# Altium footprint library 2.01-LQFP、TQFP封装.PcbLib: 191 footprints (part 11 of 13)
Each footprint in its own frame and in the unit in brackets; x right, y up, seen from the top. Pads: shape width x height; smd on the part's side, far side on the other; paste and mask are expansions set on the pad; w line width, h text height; cw(c..) or ccw(c..) is an arc to the next point about the centre after c.
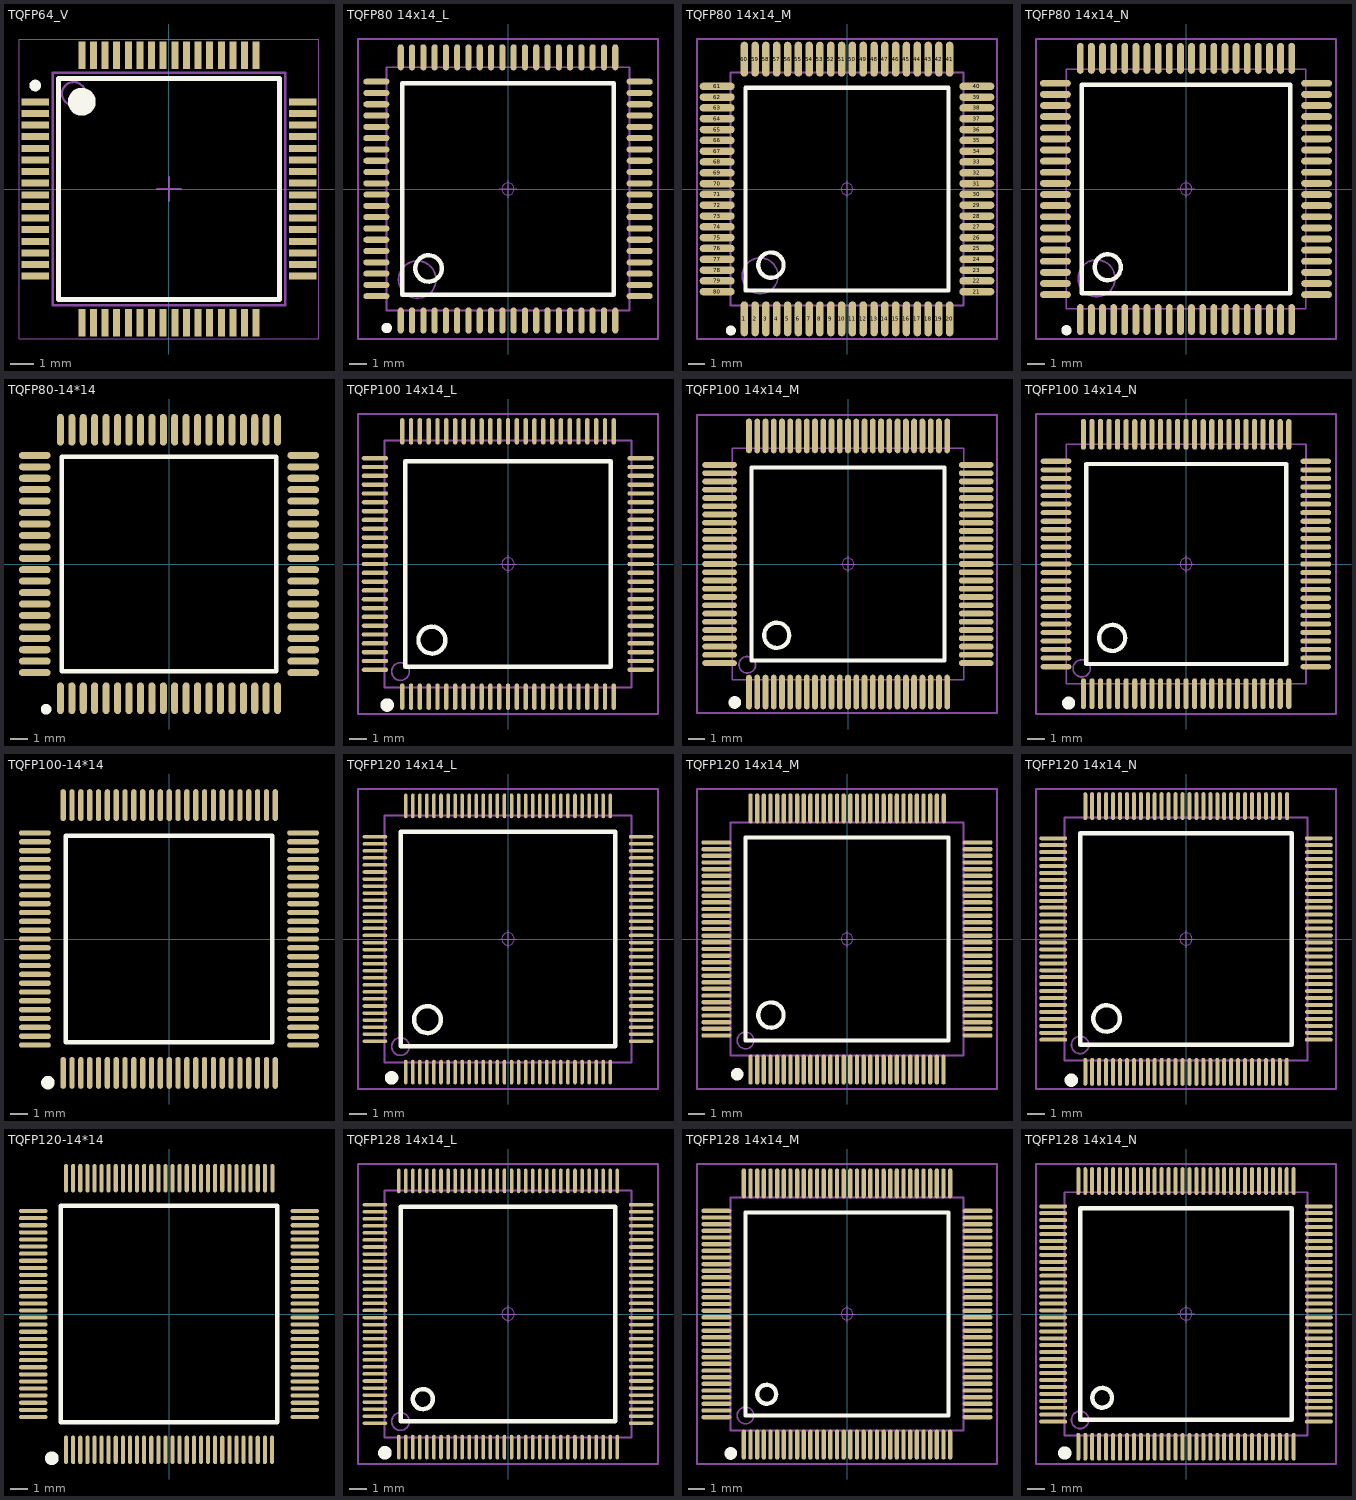
[diagram p10: the footprints below, top view; thin cyan lines are the x and y axes]

## TQFP64_V [mm] "Thin QFP, 64-Leads, Body 10x10mm, Pitch 0.5mm, ST Recommended"
height 1.6
pads (64):
  rect 1.2x0.3 smd: 1(-5.75,3.75) 2(-5.75,3.25) 3(-5.75,2.75) 4(-5.75,2.25) 5(-5.75,1.75) 6(-5.75,1.25) 7(-5.75,0.75) 8(-5.75,0.25) 9(-5.75,-0.25) 10(-5.75,-0.75) 11(-5.75,-1.25) 12(-5.75,-1.75) 13(-5.75,-2.25) 14(-5.75,-2.75) 15(-5.75,-3.25) 16(-5.75,-3.75) 33(5.75,-3.75) 34(5.75,-3.25) 35(5.75,-2.75) 36(5.75,-2.25) 37(5.75,-1.75) 38(5.75,-1.25) 39(5.75,-0.75) 40(5.75,-0.25) 41(5.75,0.25) 42(5.75,0.75) 43(5.75,1.25) 44(5.75,1.75) 45(5.75,2.25) 46(5.75,2.75) 47(5.75,3.25) 48(5.75,3.75)
  rect 0.3x1.2 smd: 17(-3.75,-5.75) 18(-3.25,-5.75) 19(-2.75,-5.75) 20(-2.25,-5.75) 21(-1.75,-5.75) 22(-1.25,-5.75) 23(-0.75,-5.75) 24(-0.25,-5.75) 25(0.25,-5.75) 26(0.75,-5.75) 27(1.25,-5.75) 28(1.75,-5.75) 29(2.25,-5.75) 30(2.75,-5.75) 31(3.25,-5.75) 32(3.75,-5.75) 49(3.75,5.75) 50(3.25,5.75) 51(2.75,5.75) 52(2.25,5.75) 53(1.75,5.75) 54(1.25,5.75) 55(0.75,5.75) 56(0.25,5.75) 57(-0.25,5.75) 58(-0.75,5.75) 59(-1.25,5.75) 60(-1.75,5.75) 61(-2.25,5.75) 62(-2.75,5.75) 63(-3.25,5.75) 64(-3.75,5.75)
Top Overlay:
  circle w0.6: c-3.75,3.75 r0.3
  circle w0.25: c-5.75,4.45 r0.125
  lines w0.2: -4.75,-4.75 4.75,-4.75 4.75,4.75 -4.75,4.75 -4.75,-4.75
Mechanical 13:
  circle w0.1: c-4.1,4.1 r0.5
  lines w0.1: -5,-5 5,-5 5,5 -5,5 -5,-5
Mechanical 15:
  lines w0.05: -6.45,-6.45 6.45,-6.45 6.45,6.45 -6.45,6.45 -6.45,-6.45
  lines w0.1: -0.5,0 0.5,0 ; 0,-0.5 0,0.5
3D body: height 1.6, standoff 0.05, extent -5,-5 5,5

## TQFP80 14x14_L [mm] "80脚，体宽：14x14mm, 脚距：0.65mm"
pads (80):
  oval 0.35x1.5 smd: 1(-6.175,-7.574) 2(-5.525,-7.574) 3(-4.875,-7.574) 4(-4.225,-7.574) 5(-3.575,-7.574) 6(-2.925,-7.574) 7(-2.275,-7.574) 8(-1.625,-7.574) 9(-0.975,-7.574) 10(-0.325,-7.574) 11(0.325,-7.574) 12(0.975,-7.574) 13(1.625,-7.574) 14(2.275,-7.574) 15(2.925,-7.574) 16(3.575,-7.574) 17(4.225,-7.574) 18(4.875,-7.574) 19(5.525,-7.574) 20(6.175,-7.574) 41(6.175,7.579) 42(5.525,7.579) 43(4.875,7.579) 44(4.225,7.579) 45(3.575,7.579) 46(2.925,7.579) 47(2.275,7.579) 48(1.625,7.579) 49(0.975,7.579) 50(0.325,7.579) 51(-0.325,7.579) 52(-0.975,7.579) 53(-1.625,7.579) 54(-2.275,7.579) 55(-2.925,7.579) 56(-3.575,7.579) 57(-4.225,7.579) 58(-4.875,7.579) 59(-5.525,7.579) 60(-6.175,7.579)
  oval 1.5x0.35 smd: 21(7.577,-6.172) 22(7.577,-5.522) 23(7.577,-4.872) 24(7.577,-4.222) 25(7.577,-3.572) 26(7.577,-2.922) 27(7.577,-2.272) 28(7.577,-1.622) 29(7.577,-0.972) 30(7.577,-0.322) 31(7.577,0.328) 32(7.577,0.978) 33(7.577,1.628) 34(7.577,2.278) 35(7.577,2.928) 36(7.577,3.578) 37(7.577,4.228) 38(7.577,4.878) 39(7.577,5.528) 40(7.577,6.178) 61(-7.577,6.178) 62(-7.577,5.528) 63(-7.577,4.878) 64(-7.577,4.228) 65(-7.577,3.578) 66(-7.577,2.928) 67(-7.577,2.278) 68(-7.577,1.628) 69(-7.577,0.978) 70(-7.577,0.328) 71(-7.577,-0.322) 72(-7.577,-0.972) 73(-7.577,-1.622) 74(-7.577,-2.272) 75(-7.577,-2.922) 76(-7.577,-3.572) 77(-7.577,-4.222) 78(-7.577,-4.872) 79(-7.577,-5.522) 80(-7.577,-6.172)
Top Overlay:
  circle w0.35: c-6.983,-8.001 r0.125
  circle w0.254: c-4.572,-4.572 r0.762
  lines w0.254: -6.096,-6.096 6.096,-6.096 6.096,6.096 -6.096,6.096 -6.096,-6.096
Mechanical 13:
  circle w0.1: c-5.222,-5.219 r1.078
  lines w0.1: -7,-6.997 -7,7.003 7,7.003 7,-6.997 -7,-6.997
Mechanical 15:
  circle w0.05: c0,0.003 r0.35
  lines w0.05: -0.5,0.003 0.5,0.003 ; 0,-0.497 0,0.503
  lines w0.1: -8.636,-8.636 8.636,-8.636 8.636,8.636 -8.636,8.636 -8.636,-8.636
3D body: height 1.05, standoff 0, extent -8.002,-8.002 8.002,8.002

## TQFP80 14x14_M [mm] "80脚，体宽：14x14mm, 脚距：0.65mm  淘宝ID:黄晶宝石"
pads (80):
  oval 0.45x2.1 smd: 1(-6.175,-7.805) 2(-5.525,-7.805) 3(-4.875,-7.805) 4(-4.225,-7.805) 5(-3.575,-7.805) 6(-2.925,-7.805) 7(-2.275,-7.805) 8(-1.625,-7.805) 9(-0.975,-7.805) 10(-0.325,-7.805) 11(0.325,-7.805) 12(0.975,-7.805) 13(1.625,-7.805) 14(2.275,-7.805) 15(2.925,-7.805) 16(3.575,-7.805) 17(4.225,-7.805) 18(4.875,-7.805) 19(5.525,-7.805) 20(6.175,-7.805) 41(6.175,7.805) 42(5.525,7.805) 43(4.875,7.805) 44(4.225,7.805) 45(3.575,7.805) 46(2.925,7.805) 47(2.275,7.805) 48(1.625,7.805) 49(0.975,7.805) 50(0.325,7.805) 51(-0.325,7.805) 52(-0.975,7.805) 53(-1.625,7.805) 54(-2.275,7.805) 55(-2.925,7.805) 56(-3.575,7.805) 57(-4.225,7.805) 58(-4.875,7.805) 59(-5.525,7.805) 60(-6.175,7.805)
  oval 2.1x0.45 smd: 21(7.805,-6.175) 22(7.805,-5.525) 23(7.805,-4.875) 24(7.805,-4.225) 25(7.805,-3.575) 26(7.805,-2.925) 27(7.805,-2.275) 28(7.805,-1.625) 29(7.805,-0.975) 30(7.805,-0.325) 31(7.805,0.325) 32(7.805,0.975) 33(7.805,1.625) 34(7.805,2.275) 35(7.805,2.925) 36(7.805,3.575) 37(7.805,4.225) 38(7.805,4.875) 39(7.805,5.525) 40(7.805,6.175) 61(-7.805,6.175) 62(-7.805,5.525) 63(-7.805,4.875) 64(-7.805,4.225) 65(-7.805,3.575) 66(-7.805,2.925) 67(-7.805,2.275) 68(-7.805,1.625) 69(-7.805,0.975) 70(-7.805,0.325) 71(-7.805,-0.325) 72(-7.805,-0.975) 73(-7.805,-1.625) 74(-7.805,-2.275) 75(-7.805,-2.925) 76(-7.805,-3.575) 77(-7.805,-4.225) 78(-7.805,-4.875) 79(-7.805,-5.525) 80(-7.805,-6.175)
Top Overlay:
  circle w0.35: c-6.985,-8.509 r0.125
  circle w0.254: c-4.572,-4.575 r0.762
  lines w0.254: -6.096,-6.099 6.096,-6.099 6.096,6.093 -6.096,6.093 -6.096,-6.099
Mechanical 13:
  circle w0.1: c-5.222,-5.222 r1.078
  lines w0.1: -7,-7 -7,7 7,7 7,-7 -7,-7
Mechanical 15:
  circle w0.05: c0,0 r0.35
  lines w0.05: -0.5,0 0.5,0 ; 0,-0.5 0,0.5
  lines w0.1: -9.017,-9.017 9.017,-9.017 9.017,9.017 -9.017,9.017 -9.017,-9.017
3D body: height 1.05, standoff 0, extent -8.002,-8.002 8.002,8.002

## TQFP80 14x14_N [mm] "80脚，体宽：14x14mm, 脚距：0.65mm"
pads (80):
  oval 0.4x1.8 smd: 1(-6.175,-7.625) 2(-5.525,-7.625) 3(-4.875,-7.625) 4(-4.225,-7.625) 5(-3.575,-7.625) 6(-2.925,-7.625) 7(-2.275,-7.625) 8(-1.625,-7.625) 9(-0.975,-7.625) 10(-0.325,-7.625) 11(0.325,-7.625) 12(0.975,-7.625) 13(1.625,-7.625) 14(2.275,-7.625) 15(2.925,-7.625) 16(3.575,-7.625) 17(4.225,-7.625) 18(4.875,-7.625) 19(5.525,-7.625) 20(6.175,-7.625) 41(6.175,7.63) 42(5.525,7.63) 43(4.875,7.63) 44(4.225,7.63) 45(3.575,7.63) 46(2.925,7.63) 47(2.275,7.63) 48(1.625,7.63) 49(0.975,7.63) 50(0.325,7.63) 51(-0.325,7.63) 52(-0.975,7.63) 53(-1.625,7.63) 54(-2.275,7.63) 55(-2.925,7.63) 56(-3.575,7.63) 57(-4.225,7.63) 58(-4.875,7.63) 59(-5.525,7.63) 60(-6.175,7.63)
  oval 1.8x0.4 smd: 21(7.627,-6.172) 22(7.627,-5.522) 23(7.627,-4.872) 24(7.627,-4.222) 25(7.627,-3.572) 26(7.627,-2.922) 27(7.627,-2.272) 28(7.627,-1.622) 29(7.627,-0.972) 30(7.627,-0.322) 31(7.627,0.328) 32(7.627,0.978) 33(7.627,1.628) 34(7.627,2.278) 35(7.627,2.928) 36(7.627,3.578) 37(7.627,4.228) 38(7.627,4.878) 39(7.627,5.528) 40(7.627,6.178) 61(-7.627,6.178) 62(-7.627,5.528) 63(-7.627,4.878) 64(-7.627,4.228) 65(-7.627,3.578) 66(-7.627,2.928) 67(-7.627,2.278) 68(-7.627,1.628) 69(-7.627,0.978) 70(-7.627,0.328) 71(-7.627,-0.322) 72(-7.627,-0.972) 73(-7.627,-1.622) 74(-7.627,-2.272) 75(-7.627,-2.922) 76(-7.627,-3.572) 77(-7.627,-4.222) 78(-7.627,-4.872) 79(-7.627,-5.522) 80(-7.627,-6.172)
Top Overlay:
  circle w0.35: c-6.985,-8.255 r0.125
  circle w0.254: c-4.572,-4.572 r0.762
  lines w0.254: -6.096,-6.096 6.096,-6.096 6.096,6.096 -6.096,6.096 -6.096,-6.096
Mechanical 13:
  circle w0.1: c-5.222,-5.219 r1.078
  lines w0.1: -7,-6.997 -7,7.003 7,7.003 7,-6.997 -7,-6.997
Mechanical 15:
  circle w0.05: c0,0.003 r0.35
  lines w0.05: -0.5,0.003 0.5,0.003 ; 0,-0.497 0,0.503
  lines w0.1: -8.763,-8.763 8.763,-8.763 8.763,8.763 -8.763,8.763 -8.763,-8.763
3D body: height 1.05, standoff 0, extent -8.002,-8.002 8.002,8.002

## TQFP80-14*14 [mm] "14x14mm, 0.65mm       封装库来自淘宝卖家 ID：黄晶宝石"
pads (80):
  oval 0.4x1.8 smd: 1(-6.175,-7.625) 2(-5.525,-7.625) 3(-4.875,-7.625) 4(-4.225,-7.625) 5(-3.575,-7.625) 6(-2.925,-7.625) 7(-2.275,-7.625) 8(-1.625,-7.625) 9(-0.975,-7.625) 10(-0.325,-7.625) 11(0.325,-7.625) 12(0.975,-7.625) 13(1.625,-7.625) 14(2.275,-7.625) 15(2.925,-7.625) 16(3.575,-7.625) 17(4.225,-7.625) 18(4.875,-7.625) 19(5.525,-7.625) 20(6.175,-7.625) 41(6.175,7.63) 42(5.525,7.63) 43(4.875,7.63) 44(4.225,7.63) 45(3.575,7.63) 46(2.925,7.63) 47(2.275,7.63) 48(1.625,7.63) 49(0.975,7.63) 50(0.325,7.63) 51(-0.325,7.63) 52(-0.975,7.63) 53(-1.625,7.63) 54(-2.275,7.63) 55(-2.925,7.63) 56(-3.575,7.63) 57(-4.225,7.63) 58(-4.875,7.63) 59(-5.525,7.63) 60(-6.175,7.63)
  oval 1.8x0.4 smd: 21(7.627,-6.172) 22(7.627,-5.522) 23(7.627,-4.872) 24(7.627,-4.222) 25(7.627,-3.572) 26(7.627,-2.922) 27(7.627,-2.272) 28(7.627,-1.622) 29(7.627,-0.972) 30(7.627,-0.322) 31(7.627,0.328) 32(7.627,0.978) 33(7.627,1.628) 34(7.627,2.278) 35(7.627,2.928) 36(7.627,3.578) 37(7.627,4.228) 38(7.627,4.878) 39(7.627,5.528) 40(7.627,6.178) 61(-7.627,6.178) 62(-7.627,5.528) 63(-7.627,4.878) 64(-7.627,4.228) 65(-7.627,3.578) 66(-7.627,2.928) 67(-7.627,2.278) 68(-7.627,1.628) 69(-7.627,0.978) 70(-7.627,0.328) 71(-7.627,-0.322) 72(-7.627,-0.972) 73(-7.627,-1.622) 74(-7.627,-2.272) 75(-7.627,-2.922) 76(-7.627,-3.572) 77(-7.627,-4.222) 78(-7.627,-4.872) 79(-7.627,-5.522) 80(-7.627,-6.172)
Top Overlay:
  circle w0.35: c-6.985,-8.255 r0.125
  lines w0.254: -6.096,-6.096 -6.096,6.096 6.096,6.096 6.096,-6.096 -6.096,-6.096
3D body: height 1.05, standoff 0, extent -8.002,-8.002 8.002,8.002

## TQFP100 14x14_L [mm] "100脚，体宽：14x14mm, 脚距：0.5mm          淘宝ID:黄晶宝石"
pads (100):
  oval 0.25x1.5 smd: 1(-6,-7.524) 2(-5.5,-7.524) 3(-5,-7.524) 4(-4.5,-7.524) 5(-4,-7.524) 6(-3.5,-7.524) 7(-3,-7.524) 8(-2.5,-7.524) 9(-2,-7.524) 10(-1.5,-7.524) 11(-1,-7.524) 12(-0.5,-7.524) 13(0,-7.524) 14(0.5,-7.524) 15(1,-7.524) 16(1.5,-7.524) 17(2,-7.524) 18(2.5,-7.524) 19(3,-7.524) 20(3.5,-7.524) 21(4,-7.524) 22(4.5,-7.524) 23(5,-7.524) 24(5.5,-7.524) 25(6,-7.524) 51(6,7.524) 52(5.5,7.524) 53(5,7.524) 54(4.5,7.524) 55(4,7.524) 56(3.5,7.524) 57(3,7.524) 58(2.5,7.524) 59(2,7.524) 60(1.5,7.524) 61(1,7.524) 62(0.5,7.524) 63(0,7.524) 64(-0.5,7.524) 65(-1,7.524) 66(-1.5,7.524) 67(-2,7.524) 68(-2.5,7.524) 69(-3,7.524) 70(-3.5,7.524) 71(-4,7.524) 72(-4.5,7.524) 73(-5,7.524) 74(-5.5,7.524) 75(-6,7.524)
  oval 1.5x0.25 smd: 26(7.524,-6) 27(7.524,-5.5) 28(7.524,-5) 29(7.524,-4.5) 30(7.524,-4) 31(7.524,-3.5) 32(7.524,-3) 33(7.524,-2.5) 34(7.524,-2) 35(7.524,-1.5) 36(7.524,-1) 37(7.524,-0.5) 38(7.524,0) 39(7.524,0.5) 40(7.524,1) 41(7.524,1.5) 42(7.524,2) 43(7.524,2.5) 44(7.524,3) 45(7.524,3.5) 46(7.524,4) 47(7.524,4.5) 48(7.524,5) 49(7.524,5.5) 50(7.524,6) 76(-7.549,6) 77(-7.549,5.5) 78(-7.549,5) 79(-7.549,4.5) 80(-7.549,4) 81(-7.549,3.5) 82(-7.549,3) 83(-7.549,2.5) 84(-7.549,2) 85(-7.549,1.5) 86(-7.549,1) 87(-7.549,0.5) 88(-7.549,0) 89(-7.549,-0.5) 90(-7.549,-1) 91(-7.549,-1.5) 92(-7.549,-2) 93(-7.549,-2.5) 94(-7.549,-3) 95(-7.549,-3.5) 96(-7.549,-4) 97(-7.549,-4.5) 98(-7.549,-5) 99(-7.549,-5.5) 100(-7.549,-6)
Top Overlay:
  circle w0.254: c-4.318,-4.318 r0.762
  circle w0.508: c-6.858,-8.001 r0.127
  lines w0.254: -5.842,-5.842 5.842,-5.842 5.842,5.842 -5.842,5.842 -5.842,-5.842
Mechanical 13:
  circle w0.1: c-6.1,-6.1 r0.5
  lines w0.1: -7,-7 7,-7 7,7 -7,7 -7,-7
Mechanical 15:
  circle w0.05: c0,0 r0.35
  lines w0.05: -0.5,0 0.5,0 ; 0,-0.5 0,0.5
  lines w0.1: -8.509,-8.509 8.509,-8.509 8.509,8.509 -8.509,8.509 -8.509,-8.509
3D body: height 1.05, standoff 0, extent -8.002,-8.002 8.002,8.002

## TQFP100 14x14_M [mm] "100脚，体宽：14x14mm, 脚距：0.5mm"
pads (100):
  oval 0.35x2.1 smd: 1(-6,-7.752) 2(-5.5,-7.752) 3(-5,-7.752) 4(-4.5,-7.752) 5(-4,-7.752) 6(-3.5,-7.752) 7(-3,-7.752) 8(-2.5,-7.752) 9(-2,-7.752) 10(-1.5,-7.752) 11(-1,-7.752) 12(-0.5,-7.752) 13(0,-7.752) 14(0.5,-7.752) 15(1,-7.752) 16(1.5,-7.752) 17(2,-7.752) 18(2.5,-7.752) 19(3,-7.752) 20(3.5,-7.752) 21(4,-7.752) 22(4.5,-7.752) 23(5,-7.752) 24(5.5,-7.752) 25(6,-7.752) 51(6,7.752) 52(5.5,7.752) 53(5,7.752) 54(4.5,7.752) 55(4,7.752) 56(3.5,7.752) 57(3,7.752) 58(2.5,7.752) 59(2,7.752) 60(1.5,7.752) 61(1,7.752) 62(0.5,7.752) 63(0,7.752) 64(-0.5,7.752) 65(-1,7.752) 66(-1.5,7.752) 67(-2,7.752) 68(-2.5,7.752) 69(-3,7.752) 70(-3.5,7.752) 71(-4,7.752) 72(-4.5,7.752) 73(-5,7.752) 74(-5.5,7.752) 75(-6,7.752)
  oval 2.1x0.35 smd: 26(7.752,-6) 27(7.752,-5.5) 28(7.752,-5) 29(7.752,-4.5) 30(7.752,-4) 31(7.752,-3.5) 32(7.752,-3) 33(7.752,-2.5) 34(7.752,-2) 35(7.752,-1.5) 36(7.752,-1) 37(7.752,-0.5) 38(7.752,0) 39(7.752,0.5) 40(7.752,1) 41(7.752,1.5) 42(7.752,2) 43(7.752,2.5) 44(7.752,3) 45(7.752,3.5) 46(7.752,4) 47(7.752,4.5) 48(7.752,5) 49(7.752,5.5) 50(7.752,6) 76(-7.778,6) 77(-7.778,5.5) 78(-7.778,5) 79(-7.778,4.5) 80(-7.778,4) 81(-7.778,3.5) 82(-7.778,3) 83(-7.778,2.5) 84(-7.778,2) 85(-7.778,1.5) 86(-7.778,1) 87(-7.778,0.5) 88(-7.778,0) 89(-7.778,-0.5) 90(-7.778,-1) 91(-7.778,-1.5) 92(-7.778,-2) 93(-7.778,-2.5) 94(-7.778,-3) 95(-7.778,-3.5) 96(-7.778,-4) 97(-7.778,-4.5) 98(-7.778,-5) 99(-7.778,-5.5) 100(-7.778,-6)
Top Overlay:
  circle w0.254: c-4.318,-4.318 r0.762
  circle w0.508: c-6.858,-8.382 r0.127
  lines w0.254: -5.842,-5.842 5.842,-5.842 5.842,5.842 -5.842,5.842 -5.842,-5.842
Mechanical 13:
  circle w0.1: c-6.1,-6.1 r0.5
  lines w0.1: -7,-7 7,-7 7,7 -7,7 -7,-7
Mechanical 15:
  circle w0.05: c0,0 r0.35
  lines w0.05: -0.5,0 0.5,0 ; 0,-0.5 0,0.5
  lines w0.1: -9.144,-9.017 9.017,-9.017 9.017,9.017 -9.144,9.017 -9.144,-9.017
3D body: height 1.05, standoff 0, extent -8.002,-8.002 8.002,8.002

## TQFP100 14x14_N [mm] "100脚，体宽：14x14mm, 脚距：0.5mm  淘宝ID:黄晶宝石"
pads (100):
  oval 0.3x1.8 smd: 1(-5.995,-7.575) 2(-5.495,-7.575) 3(-4.995,-7.575) 4(-4.495,-7.575) 5(-3.995,-7.575) 6(-3.495,-7.575) 7(-2.995,-7.575) 8(-2.495,-7.575) 9(-1.995,-7.575) 10(-1.495,-7.575) 11(-0.995,-7.575) 12(-0.495,-7.575) 13(0.005,-7.575) 14(0.505,-7.575) 15(1.005,-7.575) 16(1.505,-7.575) 17(2.005,-7.575) 18(2.505,-7.575) 19(3.005,-7.575) 20(3.505,-7.575) 21(4.005,-7.575) 22(4.505,-7.575) 23(5.005,-7.575) 24(5.505,-7.575) 25(6.005,-7.575) 51(6.005,7.575) 52(5.505,7.575) 53(5.005,7.575) 54(4.505,7.575) 55(4.005,7.575) 56(3.505,7.575) 57(3.005,7.575) 58(2.505,7.575) 59(2.005,7.575) 60(1.505,7.575) 61(1.005,7.575) 62(0.505,7.575) 63(0.005,7.575) 64(-0.495,7.575) 65(-0.995,7.575) 66(-1.495,7.575) 67(-1.995,7.575) 68(-2.495,7.575) 69(-2.995,7.575) 70(-3.495,7.575) 71(-3.995,7.575) 72(-4.495,7.575) 73(-4.995,7.575) 74(-5.495,7.575) 75(-5.995,7.575)
  oval 1.8x0.3 smd: 26(7.58,-6) 27(7.58,-5.5) 28(7.58,-5) 29(7.58,-4.5) 30(7.58,-4) 31(7.58,-3.5) 32(7.58,-3) 33(7.58,-2.5) 34(7.58,-2) 35(7.58,-1.5) 36(7.58,-1) 37(7.58,-0.5) 38(7.58,0) 39(7.58,0.5) 40(7.58,1) 41(7.58,1.5) 42(7.58,2) 43(7.58,2.5) 44(7.58,3) 45(7.58,3.5) 46(7.58,4) 47(7.58,4.5) 48(7.58,5) 49(7.58,5.5) 50(7.58,6) 76(-7.595,6) 77(-7.595,5.5) 78(-7.595,5) 79(-7.595,4.5) 80(-7.595,4) 81(-7.595,3.5) 82(-7.595,3) 83(-7.595,2.5) 84(-7.595,2) 85(-7.595,1.5) 86(-7.595,1) 87(-7.595,0.5) 88(-7.595,0) 89(-7.595,-0.5) 90(-7.595,-1) 91(-7.595,-1.5) 92(-7.595,-2) 93(-7.595,-2.5) 94(-7.595,-3) 95(-7.595,-3.5) 96(-7.595,-4) 97(-7.595,-4.5) 98(-7.595,-5) 99(-7.595,-5.5) 100(-7.595,-6)
Top Overlay:
  circle w0.254: c-4.313,-4.318 r0.762
  circle w0.508: c-6.858,-8.128 r0.127
  lines w0.254: -5.837,-5.842 5.847,-5.842 5.847,5.842 -5.837,5.842 -5.837,-5.842
Mechanical 13:
  circle w0.1: c-6.095,-6.1 r0.5
  lines w0.1: -6.995,-7 7.005,-7 7.005,7 -6.995,7 -6.995,-7
Mechanical 15:
  circle w0.05: c0.005,0 r0.35
  lines w0.05: -0.495,0 0.505,0 ; 0.005,-0.5 0.005,0.5
  lines w0.1: -8.763,-8.763 8.763,-8.763 8.763,8.763 -8.763,8.763 -8.763,-8.763
3D body: height 1.05, standoff 0, extent -7.999,-8.003 8.005,8.001

## TQFP100-14*14 [mm] "14x14mm, 0.5mm      封装库来自淘宝卖家 ID：黄晶宝石"
pads (100):
  oval 0.3x1.8 smd: 1(-5.995,-7.575) 2(-5.495,-7.575) 3(-4.995,-7.575) 4(-4.495,-7.575) 5(-3.995,-7.575) 6(-3.495,-7.575) 7(-2.995,-7.575) 8(-2.495,-7.575) 9(-1.995,-7.575) 10(-1.495,-7.575) 11(-0.995,-7.575) 12(-0.495,-7.575) 13(0.005,-7.575) 14(0.505,-7.575) 15(1.005,-7.575) 16(1.505,-7.575) 17(2.005,-7.575) 18(2.505,-7.575) 19(3.005,-7.575) 20(3.505,-7.575) 21(4.005,-7.575) 22(4.505,-7.575) 23(5.005,-7.575) 24(5.505,-7.575) 25(6.005,-7.575) 51(6.005,7.575) 52(5.505,7.575) 53(5.005,7.575) 54(4.505,7.575) 55(4.005,7.575) 56(3.505,7.575) 57(3.005,7.575) 58(2.505,7.575) 59(2.005,7.575) 60(1.505,7.575) 61(1.005,7.575) 62(0.505,7.575) 63(0.005,7.575) 64(-0.495,7.575) 65(-0.995,7.575) 66(-1.495,7.575) 67(-1.995,7.575) 68(-2.495,7.575) 69(-2.995,7.575) 70(-3.495,7.575) 71(-3.995,7.575) 72(-4.495,7.575) 73(-4.995,7.575) 74(-5.495,7.575) 75(-5.995,7.575)
  oval 1.8x0.3 smd: 26(7.58,-6) 27(7.58,-5.5) 28(7.58,-5) 29(7.58,-4.5) 30(7.58,-4) 31(7.58,-3.5) 32(7.58,-3) 33(7.58,-2.5) 34(7.58,-2) 35(7.58,-1.5) 36(7.58,-1) 37(7.58,-0.5) 38(7.58,0) 39(7.58,0.5) 40(7.58,1) 41(7.58,1.5) 42(7.58,2) 43(7.58,2.5) 44(7.58,3) 45(7.58,3.5) 46(7.58,4) 47(7.58,4.5) 48(7.58,5) 49(7.58,5.5) 50(7.58,6) 76(-7.595,6) 77(-7.595,5.5) 78(-7.595,5) 79(-7.595,4.5) 80(-7.595,4) 81(-7.595,3.5) 82(-7.595,3) 83(-7.595,2.5) 84(-7.595,2) 85(-7.595,1.5) 86(-7.595,1) 87(-7.595,0.5) 88(-7.595,0) 89(-7.595,-0.5) 90(-7.595,-1) 91(-7.595,-1.5) 92(-7.595,-2) 93(-7.595,-2.5) 94(-7.595,-3) 95(-7.595,-3.5) 96(-7.595,-4) 97(-7.595,-4.5) 98(-7.595,-5) 99(-7.595,-5.5) 100(-7.595,-6)
Top Overlay:
  circle w0.508: c-6.858,-8.128 r0.127
  lines w0.254: -5.837,-5.842 -5.837,5.842 5.847,5.842 5.847,-5.842 -5.837,-5.842
3D body: height 1.05, standoff 0, extent -8.002,-8.002 8.002,8.002

## TQFP120 14x14_L [mm] "120脚，体宽：14x14mm, 脚距：0.4mm 淘宝ID:黄晶宝石"
pads (120):
  oval 0.2x1.4 smd: 1(-5.8,-7.549) 2(-5.4,-7.549) 3(-5,-7.549) 4(-4.6,-7.549) 5(-4.2,-7.549) 6(-3.8,-7.549) 7(-3.4,-7.549) 8(-3,-7.549) 9(-2.6,-7.549) 10(-2.2,-7.549) 11(-1.8,-7.549) 12(-1.4,-7.549) 13(-1,-7.549) 14(-0.6,-7.549) 15(-0.2,-7.549) 16(0.2,-7.549) 17(0.6,-7.549) 18(1,-7.549) 19(1.4,-7.549) 20(1.8,-7.549) 21(2.2,-7.549) 22(2.6,-7.549) 23(3,-7.549) 24(3.4,-7.549) 25(3.8,-7.549) 26(4.2,-7.549) 27(4.6,-7.549) 28(5,-7.549) 29(5.4,-7.549) 30(5.8,-7.549) 61(5.8,7.549) 62(5.4,7.549) 63(5,7.549) 64(4.6,7.549) 65(4.2,7.549) 66(3.8,7.549) 67(3.4,7.549) 68(3,7.549) 69(2.6,7.549) 70(2.2,7.549) 71(1.8,7.549) 72(1.4,7.549) 73(1,7.549) 74(0.6,7.549) 75(0.2,7.549) 76(-0.2,7.549) 77(-0.6,7.549) 78(-1,7.549) 79(-1.4,7.549) 80(-1.8,7.549) 81(-2.2,7.549) 82(-2.6,7.549) 83(-3,7.549) 84(-3.4,7.549) 85(-3.8,7.549) 86(-4.2,7.549) 87(-4.6,7.549) 88(-5,7.549) 89(-5.4,7.549) 90(-5.8,7.549)
  oval 1.4x0.2 smd: 31(7.549,-5.8) 32(7.549,-5.4) 33(7.549,-5) 34(7.549,-4.6) 35(7.549,-4.2) 36(7.549,-3.8) 37(7.549,-3.4) 38(7.549,-3) 39(7.549,-2.6) 40(7.549,-2.2) 41(7.549,-1.8) 42(7.549,-1.4) 43(7.549,-1) 44(7.549,-0.6) 45(7.549,-0.2) 46(7.549,0.2) 47(7.549,0.6) 48(7.549,1) 49(7.549,1.4) 50(7.549,1.8) 51(7.549,2.2) 52(7.549,2.6) 53(7.549,3) 54(7.549,3.4) 55(7.549,3.8) 56(7.549,4.2) 57(7.549,4.6) 58(7.549,5) 59(7.549,5.4) 60(7.549,5.8) 91(-7.549,5.8) 92(-7.549,5.4) 93(-7.549,5) 94(-7.549,4.6) 95(-7.549,4.2) 96(-7.549,3.8) 97(-7.549,3.4) 98(-7.549,3) 99(-7.549,2.6) 100(-7.549,2.2) 101(-7.549,1.8) 102(-7.549,1.4) 103(-7.549,1) 104(-7.549,0.6) 105(-7.549,0.2) 106(-7.549,-0.2) 107(-7.549,-0.6) 108(-7.549,-1) 109(-7.549,-1.4) 110(-7.549,-1.8) 111(-7.549,-2.2) 112(-7.549,-2.6) 113(-7.549,-3) 114(-7.549,-3.4) 115(-7.549,-3.8) 116(-7.549,-4.2) 117(-7.549,-4.6) 118(-7.549,-5) 119(-7.549,-5.4) 120(-7.549,-5.8)
Top Overlay:
  circle w0.254: c-4.572,-4.572 r0.762
  circle w0.508: c-6.604,-7.874 r0.127
  lines w0.254: -6.096,-6.096 -6.096,6.096 6.096,6.096 6.096,-6.096 -6.096,-6.096
Mechanical 13:
  circle w0.1: c-6.1,-6.1 r0.5
  lines w0.1: -7,-7 -7,7 7,7 7,-7 -7,-7
Mechanical 15:
  circle w0.05: c0,0 r0.35
  lines w0.05: -0.5,0 0.5,0 ; 0,-0.5 0,0.5
  lines w0.1: -8.509,-8.509 -8.509,8.509 8.509,8.509 8.509,-8.509 -8.509,-8.509
3D body: height 1.05, standoff 0, extent -8.002,-8.002 8.002,8.002

## TQFP120 14x14_M [mm] "120脚，体宽：14x14mm, 脚距：0.4mm"
pads (120):
  oval 0.26x1.8 smd: 1(-5.8,-7.854) 2(-5.4,-7.854) 3(-5,-7.854) 4(-4.6,-7.854) 5(-4.2,-7.854) 6(-3.8,-7.854) 7(-3.4,-7.854) 8(-3,-7.854) 9(-2.6,-7.854) 10(-2.2,-7.854) 11(-1.8,-7.854) 12(-1.4,-7.854) 13(-1,-7.854) 14(-0.6,-7.854) 15(-0.2,-7.854) 16(0.2,-7.854) 17(0.6,-7.854) 18(1,-7.854) 19(1.4,-7.854) 20(1.8,-7.854) 21(2.2,-7.854) 22(2.6,-7.854) 23(3,-7.854) 24(3.4,-7.854) 25(3.8,-7.854) 26(4.2,-7.854) 27(4.6,-7.854) 28(5,-7.854) 29(5.4,-7.854) 30(5.8,-7.854) 61(5.825,7.854) 62(5.4,7.854) 63(5,7.854) 64(4.6,7.854) 65(4.2,7.854) 66(3.8,7.854) 67(3.4,7.854) 68(3,7.854) 69(2.6,7.854) 70(2.2,7.854) 71(1.8,7.854) 72(1.4,7.854) 73(1,7.854) 74(0.6,7.854) 75(0.2,7.854) 76(-0.2,7.854) 77(-0.6,7.854) 78(-1,7.854) 79(-1.4,7.854) 80(-1.8,7.854) 81(-2.2,7.854) 82(-2.6,7.854) 83(-3,7.854) 84(-3.4,7.854) 85(-3.8,7.854) 86(-4.2,7.854) 87(-4.6,7.854) 88(-5,7.854) 89(-5.4,7.854) 90(-5.8,7.854)
  oval 1.8x0.26 smd: 31(7.854,-5.8) 32(7.854,-5.4) 33(7.854,-5) 34(7.854,-4.6) 35(7.854,-4.2) 36(7.854,-3.8) 37(7.854,-3.4) 38(7.854,-3) 39(7.854,-2.6) 40(7.854,-2.2) 41(7.854,-1.8) 42(7.854,-1.4) 43(7.854,-1) 44(7.854,-0.6) 45(7.854,-0.2) 46(7.854,0.2) 47(7.854,0.6) 48(7.854,1) 49(7.854,1.4) 50(7.854,1.8) 51(7.854,2.2) 52(7.854,2.6) 53(7.854,3) 54(7.854,3.4) 55(7.854,3.8) 56(7.854,4.2) 57(7.854,4.6) 58(7.854,5) 59(7.854,5.4) 60(7.854,5.8) 91(-7.854,5.8) 92(-7.854,5.4) 93(-7.854,5) 94(-7.854,4.6) 95(-7.854,4.2) 96(-7.854,3.8) 97(-7.854,3.4) 98(-7.854,3) 99(-7.854,2.6) 100(-7.854,2.2) 101(-7.854,1.8) 102(-7.854,1.4) 103(-7.854,1) 104(-7.854,0.6) 105(-7.854,0.2) 106(-7.854,-0.2) 107(-7.854,-0.6) 108(-7.854,-1) 109(-7.854,-1.4) 110(-7.854,-1.8) 111(-7.854,-2.2) 112(-7.854,-2.6) 113(-7.854,-3) 114(-7.854,-3.4) 115(-7.854,-3.8) 116(-7.854,-4.2) 117(-7.854,-4.6) 118(-7.854,-5) 119(-7.854,-5.4) 120(-7.854,-5.8)
Top Overlay:
  circle w0.508: c-6.604,-8.128 r0.127
  circle w0.254: c-4.572,-4.572 r0.762
  lines w0.254: -6.096,-6.096 6.096,-6.096 6.096,6.096 -6.096,6.096 -6.096,-6.096
Mechanical 13:
  circle w0.1: c-6.1,-6.1 r0.5
  lines w0.1: -7,-7 7,-7 7,7 -7,7 -7,-7
Mechanical 15:
  circle w0.05: c0,0 r0.35
  lines w0.05: -0.5,0 0.5,0 ; 0,-0.5 0,0.5
  lines w0.1: -9.017,-9.017 9.017,-9.017 9.017,9.017 -9.017,9.017 -9.017,-9.017
3D body: height 1.05, standoff 0, extent -8.002,-8.002 8.002,8.002

## TQFP120 14x14_N [mm] "120脚，体宽：14x14mm, 脚距：0.4mm 淘宝ID:黄晶宝石"
pads (120):
  oval 0.23x1.6 smd: 1(-5.8,-7.651) 2(-5.4,-7.651) 3(-5,-7.651) 4(-4.6,-7.651) 5(-4.2,-7.651) 6(-3.8,-7.651) 7(-3.4,-7.651) 8(-3,-7.651) 9(-2.6,-7.651) 10(-2.2,-7.651) 11(-1.8,-7.651) 12(-1.4,-7.651) 13(-1,-7.651) 14(-0.6,-7.651) 15(-0.2,-7.651) 16(0.2,-7.651) 17(0.6,-7.651) 18(1,-7.651) 19(1.4,-7.651) 20(1.8,-7.651) 21(2.2,-7.651) 22(2.6,-7.651) 23(3,-7.651) 24(3.4,-7.651) 25(3.8,-7.651) 26(4.2,-7.651) 27(4.6,-7.651) 28(5,-7.651) 29(5.4,-7.651) 30(5.8,-7.651) 61(5.825,7.651) 62(5.4,7.651) 63(5,7.651) 64(4.6,7.651) 65(4.2,7.651) 66(3.8,7.651) 67(3.4,7.651) 68(3,7.651) 69(2.6,7.651) 70(2.2,7.651) 71(1.8,7.651) 72(1.4,7.651) 73(1,7.651) 74(0.6,7.651) 75(0.2,7.651) 76(-0.2,7.651) 77(-0.6,7.651) 78(-1,7.651) 79(-1.4,7.651) 80(-1.8,7.651) 81(-2.2,7.651) 82(-2.6,7.651) 83(-3,7.651) 84(-3.4,7.651) 85(-3.8,7.651) 86(-4.2,7.651) 87(-4.6,7.651) 88(-5,7.651) 89(-5.4,7.651) 90(-5.8,7.651)
  oval 1.6x0.23 smd: 31(7.651,-5.8) 32(7.651,-5.4) 33(7.651,-5) 34(7.651,-4.6) 35(7.651,-4.2) 36(7.651,-3.8) 37(7.651,-3.4) 38(7.651,-3) 39(7.651,-2.6) 40(7.651,-2.2) 41(7.651,-1.8) 42(7.651,-1.4) 43(7.651,-1) 44(7.651,-0.6) 45(7.651,-0.2) 46(7.651,0.2) 47(7.651,0.6) 48(7.651,1) 49(7.651,1.4) 50(7.651,1.8) 51(7.651,2.2) 52(7.651,2.6) 53(7.651,3) 54(7.651,3.4) 55(7.651,3.8) 56(7.651,4.2) 57(7.651,4.6) 58(7.651,5) 59(7.651,5.4) 60(7.651,5.8) 91(-7.651,5.8) 92(-7.651,5.4) 93(-7.651,5) 94(-7.651,4.6) 95(-7.651,4.2) 96(-7.651,3.8) 97(-7.651,3.4) 98(-7.651,3) 99(-7.651,2.6) 100(-7.651,2.2) 101(-7.651,1.8) 102(-7.651,1.4) 103(-7.651,1) 104(-7.651,0.6) 105(-7.651,0.2) 106(-7.651,-0.2) 107(-7.651,-0.6) 108(-7.651,-1) 109(-7.651,-1.4) 110(-7.651,-1.8) 111(-7.651,-2.2) 112(-7.651,-2.6) 113(-7.651,-3) 114(-7.651,-3.4) 115(-7.651,-3.8) 116(-7.651,-4.2) 117(-7.651,-4.6) 118(-7.651,-5) 119(-7.651,-5.4) 120(-7.651,-5.8)
Top Overlay:
  circle w0.508: c-6.604,-8.128 r0.127
  circle w0.254: c-4.572,-4.572 r0.762
  lines w0.254: -6.096,-6.096 6.096,-6.096 6.096,6.096 -6.096,6.096 -6.096,-6.096
Mechanical 13:
  circle w0.1: c-6.1,-6.1 r0.5
  lines w0.1: -7,-7 7,-7 7,7 -7,7 -7,-7
Mechanical 15:
  circle w0.05: c0,0 r0.35
  lines w0.05: -0.5,0 0.5,0 ; 0,-0.5 0,0.5
  lines w0.1: -8.636,-8.636 8.636,-8.636 8.636,8.636 -8.636,8.636 -8.636,-8.636
3D body: height 1.05, standoff 0, extent -8.002,-8.002 8.002,8.002

## TQFP120-14*14 [mm] "14x14mm, 0.4mm      封装库来自淘宝卖家 ID：黄晶宝石"
pads (120):
  oval 0.23x1.6 smd: 1(-5.8,-7.651) 2(-5.4,-7.651) 3(-5,-7.651) 4(-4.6,-7.651) 5(-4.2,-7.651) 6(-3.8,-7.651) 7(-3.4,-7.651) 8(-3,-7.651) 9(-2.6,-7.651) 10(-2.2,-7.651) 11(-1.8,-7.651) 12(-1.4,-7.651) 13(-1,-7.651) 14(-0.6,-7.651) 15(-0.2,-7.651) 16(0.2,-7.651) 17(0.6,-7.651) 18(1,-7.651) 19(1.4,-7.651) 20(1.8,-7.651) 21(2.2,-7.651) 22(2.6,-7.651) 23(3,-7.651) 24(3.4,-7.651) 25(3.8,-7.651) 26(4.2,-7.651) 27(4.6,-7.651) 28(5,-7.651) 29(5.4,-7.651) 30(5.8,-7.651) 61(5.825,7.651) 62(5.4,7.651) 63(5,7.651) 64(4.6,7.651) 65(4.2,7.651) 66(3.8,7.651) 67(3.4,7.651) 68(3,7.651) 69(2.6,7.651) 70(2.2,7.651) 71(1.8,7.651) 72(1.4,7.651) 73(1,7.651) 74(0.6,7.651) 75(0.2,7.651) 76(-0.2,7.651) 77(-0.6,7.651) 78(-1,7.651) 79(-1.4,7.651) 80(-1.8,7.651) 81(-2.2,7.651) 82(-2.6,7.651) 83(-3,7.651) 84(-3.4,7.651) 85(-3.8,7.651) 86(-4.2,7.651) 87(-4.6,7.651) 88(-5,7.651) 89(-5.4,7.651) 90(-5.8,7.651)
  oval 1.6x0.23 smd: 31(7.651,-5.8) 32(7.651,-5.4) 33(7.651,-5) 34(7.651,-4.6) 35(7.651,-4.2) 36(7.651,-3.8) 37(7.651,-3.4) 38(7.651,-3) 39(7.651,-2.6) 40(7.651,-2.2) 41(7.651,-1.8) 42(7.651,-1.4) 43(7.651,-1) 44(7.651,-0.6) 45(7.651,-0.2) 46(7.651,0.2) 47(7.651,0.6) 48(7.651,1) 49(7.651,1.4) 50(7.651,1.8) 51(7.651,2.2) 52(7.651,2.6) 53(7.651,3) 54(7.651,3.4) 55(7.651,3.8) 56(7.651,4.2) 57(7.651,4.6) 58(7.651,5) 59(7.651,5.4) 60(7.651,5.8) 91(-7.651,5.8) 92(-7.651,5.4) 93(-7.651,5) 94(-7.651,4.6) 95(-7.651,4.2) 96(-7.651,3.8) 97(-7.651,3.4) 98(-7.651,3) 99(-7.651,2.6) 100(-7.651,2.2) 101(-7.651,1.8) 102(-7.651,1.4) 103(-7.651,1) 104(-7.651,0.6) 105(-7.651,0.2) 106(-7.651,-0.2) 107(-7.651,-0.6) 108(-7.651,-1) 109(-7.651,-1.4) 110(-7.651,-1.8) 111(-7.651,-2.2) 112(-7.651,-2.6) 113(-7.651,-3) 114(-7.651,-3.4) 115(-7.651,-3.8) 116(-7.651,-4.2) 117(-7.651,-4.6) 118(-7.651,-5) 119(-7.651,-5.4) 120(-7.651,-5.8)
Top Overlay:
  circle w0.508: c-6.604,-8.128 r0.127
  lines w0.254: -6.096,-6.096 -6.096,6.096 6.096,6.096 6.096,-6.096 -6.096,-6.096
3D body: height 1.05, standoff 0, extent -8.002,-8.002 8.002,8.002

## TQFP128 14x14_L [mm] "128脚，体宽：14x14mm, 脚距：0.4mm"
pads (128):
  oval 0.2x1.4 smd: 1(-6.2,-7.549) 2(-5.8,-7.549) 3(-5.4,-7.549) 4(-5,-7.549) 5(-4.6,-7.549) 6(-4.2,-7.549) 7(-3.8,-7.549) 8(-3.4,-7.549) 9(-3,-7.549) 10(-2.6,-7.549) 11(-2.2,-7.549) 12(-1.8,-7.549) 13(-1.4,-7.549) 14(-1,-7.549) 15(-0.6,-7.549) 16(-0.2,-7.549) 17(0.2,-7.549) 18(0.6,-7.549) 19(1,-7.549) 20(1.4,-7.549) 21(1.8,-7.549) 22(2.2,-7.549) 23(2.6,-7.549) 24(3,-7.549) 25(3.4,-7.549) 26(3.8,-7.549) 27(4.2,-7.549) 28(4.6,-7.549) 29(5,-7.549) 30(5.4,-7.549) 31(5.8,-7.549) 32(6.2,-7.549) 65(6.2,7.549) 66(5.8,7.549) 67(5.4,7.549) 68(5,7.549) 69(4.6,7.549) 70(4.2,7.549) 71(3.8,7.549) 72(3.4,7.549) 73(3,7.549) 74(2.6,7.549) 75(2.2,7.549) 76(1.8,7.549) 77(1.4,7.549) 78(1,7.549) 79(0.6,7.549) 80(0.2,7.549) 81(-0.2,7.549) 82(-0.6,7.549) 83(-1,7.549) 84(-1.4,7.549) 85(-1.8,7.549) 86(-2.2,7.549) 87(-2.6,7.549) 88(-3,7.549) 89(-3.4,7.549) 90(-3.8,7.549) 91(-4.2,7.549) 92(-4.6,7.549) 93(-5,7.549) 94(-5.4,7.549) 95(-5.8,7.549) 96(-6.2,7.549)
  oval 1.4x0.2 smd: 33(7.549,-6.2) 34(7.549,-5.8) 35(7.549,-5.4) 36(7.549,-5) 37(7.549,-4.6) 38(7.549,-4.2) 39(7.549,-3.8) 40(7.549,-3.4) 41(7.549,-3) 42(7.549,-2.6) 43(7.549,-2.2) 44(7.549,-1.8) 45(7.549,-1.4) 46(7.549,-1) 47(7.549,-0.6) 48(7.549,-0.2) 49(7.549,0.2) 50(7.549,0.6) 51(7.549,1) 52(7.549,1.4) 53(7.549,1.8) 54(7.549,2.2) 55(7.549,2.6) 56(7.549,3) 57(7.549,3.4) 58(7.549,3.8) 59(7.549,4.2) 60(7.549,4.6) 61(7.549,5) 62(7.549,5.4) 63(7.549,5.8) 64(7.549,6.2) 97(-7.549,6.2) 98(-7.549,5.8) 99(-7.549,5.4) 100(-7.549,5) 101(-7.549,4.6) 102(-7.549,4.2) 103(-7.549,3.8) 104(-7.549,3.4) 105(-7.549,3) 106(-7.549,2.6) 107(-7.549,2.2) 108(-7.549,1.8) 109(-7.549,1.4) 110(-7.549,1) 111(-7.549,0.6) 112(-7.549,0.2) 113(-7.549,-0.2) 114(-7.549,-0.6) 115(-7.549,-1) 116(-7.549,-1.4) 117(-7.549,-1.8) 118(-7.549,-2.2) 119(-7.549,-2.6) 120(-7.549,-3) 121(-7.549,-3.4) 122(-7.549,-3.8) 123(-7.549,-4.2) 124(-7.549,-4.6) 125(-7.549,-5) 126(-7.549,-5.4) 127(-7.549,-5.8) 128(-7.549,-6.2)
Top Overlay:
  circle w0.508: c-6.985,-7.874 r0.127
  circle w0.254: c-4.826,-4.826 r0.568
  lines w0.254: -6.096,-6.096 6.096,-6.096 6.096,6.096 -6.096,6.096 -6.096,-6.096
Mechanical 13:
  circle w0.1: c-6.1,-6.1 r0.5
  lines w0.1: -7,-7 -7,7 7,7 7,-7 -7,-7
Mechanical 15:
  circle w0.05: c0,0 r0.35
  lines w0.05: -0.5,0 0.5,0 ; 0,-0.5 0,0.5
  lines w0.1: -8.509,-8.509 8.509,-8.509 8.509,8.509 -8.509,8.509 -8.509,-8.509
3D body: height 1.05, standoff 0, extent -8.002,-8.002 8.002,8.002

## TQFP128 14x14_M [mm] "128脚，体宽：14x14mm, 脚距：0.4mm"
pads (128):
  oval 0.26x1.8 smd: 1(-6.2,-7.854) 2(-5.8,-7.854) 3(-5.4,-7.854) 4(-5,-7.854) 5(-4.6,-7.854) 6(-4.2,-7.854) 7(-3.8,-7.854) 8(-3.4,-7.854) 9(-3,-7.854) 10(-2.6,-7.854) 11(-2.2,-7.854) 12(-1.8,-7.854) 13(-1.4,-7.854) 14(-1,-7.854) 15(-0.6,-7.854) 16(-0.2,-7.854) 17(0.2,-7.854) 18(0.6,-7.854) 19(1,-7.854) 20(1.4,-7.854) 21(1.8,-7.854) 22(2.2,-7.854) 23(2.6,-7.854) 24(3,-7.854) 25(3.4,-7.854) 26(3.8,-7.854) 27(4.2,-7.854) 28(4.6,-7.854) 29(5,-7.854) 30(5.4,-7.854) 31(5.8,-7.854) 32(6.2,-7.854) 65(6.2,7.854) 66(5.8,7.854) 67(5.4,7.854) 68(5,7.854) 69(4.6,7.854) 70(4.2,7.854) 71(3.8,7.854) 72(3.4,7.854) 73(3,7.854) 74(2.6,7.854) 75(2.2,7.854) 76(1.8,7.854) 77(1.4,7.854) 78(1,7.854) 79(0.6,7.854) 80(0.2,7.854) 81(-0.2,7.854) 82(-0.6,7.854) 83(-1,7.854) 84(-1.4,7.854) 85(-1.8,7.854) 86(-2.2,7.854) 87(-2.6,7.854) 88(-3,7.854) 89(-3.4,7.854) 90(-3.8,7.854) 91(-4.2,7.854) 92(-4.6,7.854) 93(-5,7.854) 94(-5.4,7.854) 95(-5.8,7.854) 96(-6.2,7.854)
  oval 1.8x0.26 smd: 33(7.854,-6.2) 34(7.854,-5.8) 35(7.854,-5.4) 36(7.854,-5) 37(7.854,-4.6) 38(7.854,-4.2) 39(7.854,-3.8) 40(7.854,-3.4) 41(7.854,-3) 42(7.854,-2.6) 43(7.854,-2.2) 44(7.854,-1.8) 45(7.854,-1.4) 46(7.854,-1) 47(7.854,-0.6) 48(7.854,-0.2) 49(7.854,0.2) 50(7.854,0.6) 51(7.854,1) 52(7.854,1.4) 53(7.854,1.8) 54(7.854,2.2) 55(7.854,2.6) 56(7.854,3) 57(7.854,3.4) 58(7.854,3.8) 59(7.854,4.2) 60(7.854,4.6) 61(7.854,5) 62(7.854,5.4) 63(7.854,5.8) 64(7.854,6.2) 97(-7.854,6.2) 98(-7.854,5.8) 99(-7.854,5.4) 100(-7.854,5) 101(-7.854,4.6) 102(-7.854,4.2) 103(-7.854,3.8) 104(-7.854,3.4) 105(-7.854,3) 106(-7.854,2.6) 107(-7.854,2.2) 108(-7.854,1.8) 109(-7.854,1.4) 110(-7.854,1) 111(-7.854,0.6) 112(-7.854,0.2) 113(-7.854,-0.2) 114(-7.854,-0.6) 115(-7.854,-1) 116(-7.854,-1.4) 117(-7.854,-1.8) 118(-7.854,-2.2) 119(-7.854,-2.6) 120(-7.854,-3) 121(-7.854,-3.4) 122(-7.854,-3.8) 123(-7.854,-4.2) 124(-7.854,-4.6) 125(-7.854,-5) 126(-7.854,-5.4) 127(-7.854,-5.8) 128(-7.854,-6.2)
Top Overlay:
  circle w0.508: c-6.985,-8.382 r0.127
  circle w0.254: c-4.826,-4.826 r0.568
  lines w0.254: -6.096,-6.096 6.096,-6.096 6.096,6.096 -6.096,6.096 -6.096,-6.096
Mechanical 13:
  circle w0.1: c-6.1,-6.1 r0.5
  lines w0.1: -7,-7 -7,7 7,7 7,-7 -7,-7
Mechanical 15:
  circle w0.05: c0,0 r0.35
  lines w0.05: -0.5,0 0.5,0 ; 0,-0.5 0,0.5
  lines w0.1: -9.017,-9.017 9.017,-9.017 9.017,9.017 -9.017,9.017 -9.017,-9.017
3D body: height 1.05, standoff 0, extent -8.002,-8.002 8.002,8.002

## TQFP128 14x14_N [mm] "128脚，体宽：14x14mm, 脚距：0.4mm"
pads (128):
  oval 0.23x1.6 smd: 1(-6.2,-7.648) 2(-5.8,-7.648) 3(-5.4,-7.648) 4(-5,-7.648) 5(-4.6,-7.648) 6(-4.2,-7.648) 7(-3.8,-7.648) 8(-3.4,-7.648) 9(-3,-7.648) 10(-2.6,-7.648) 11(-2.2,-7.648) 12(-1.8,-7.648) 13(-1.4,-7.648) 14(-1,-7.648) 15(-0.6,-7.648) 16(-0.2,-7.648) 17(0.2,-7.648) 18(0.6,-7.648) 19(1,-7.648) 20(1.4,-7.648) 21(1.8,-7.648) 22(2.2,-7.648) 23(2.6,-7.648) 24(3,-7.648) 25(3.4,-7.648) 26(3.8,-7.648) 27(4.2,-7.648) 28(4.6,-7.648) 29(5,-7.648) 30(5.4,-7.648) 31(5.8,-7.648) 32(6.2,-7.648) 65(6.2,7.653) 66(5.8,7.653) 67(5.4,7.653) 68(5,7.653) 69(4.6,7.653) 70(4.2,7.653) 71(3.8,7.653) 72(3.4,7.653) 73(3,7.653) 74(2.6,7.653) 75(2.2,7.653) 76(1.8,7.653) 77(1.4,7.653) 78(1,7.653) 79(0.6,7.653) 80(0.2,7.653) 81(-0.2,7.653) 82(-0.6,7.653) 83(-1,7.653) 84(-1.4,7.653) 85(-1.8,7.653) 86(-2.2,7.653) 87(-2.6,7.653) 88(-3,7.653) 89(-3.4,7.653) 90(-3.8,7.653) 91(-4.2,7.653) 92(-4.6,7.653) 93(-5,7.653) 94(-5.4,7.653) 95(-5.8,7.653) 96(-6.2,7.653)
  oval 1.6x0.23 smd: 33(7.651,-6.198) 34(7.651,-5.798) 35(7.651,-5.398) 36(7.651,-4.998) 37(7.651,-4.598) 38(7.651,-4.198) 39(7.651,-3.798) 40(7.651,-3.398) 41(7.651,-2.998) 42(7.651,-2.598) 43(7.651,-2.198) 44(7.651,-1.798) 45(7.651,-1.398) 46(7.651,-0.998) 47(7.651,-0.598) 48(7.651,-0.198) 49(7.651,0.202) 50(7.651,0.602) 51(7.651,1.002) 52(7.651,1.402) 53(7.651,1.802) 54(7.651,2.202) 55(7.651,2.602) 56(7.651,3.002) 57(7.651,3.402) 58(7.651,3.802) 59(7.651,4.202) 60(7.651,4.602) 61(7.651,5.002) 62(7.651,5.402) 63(7.651,5.802) 64(7.651,6.202) 97(-7.651,6.202) 98(-7.651,5.802) 99(-7.651,5.402) 100(-7.651,5.002) 101(-7.651,4.602) 102(-7.651,4.202) 103(-7.651,3.802) 104(-7.651,3.402) 105(-7.651,3.002) 106(-7.651,2.602) 107(-7.651,2.202) 108(-7.651,1.802) 109(-7.651,1.402) 110(-7.651,1.002) 111(-7.651,0.602) 112(-7.651,0.202) 113(-7.651,-0.198) 114(-7.651,-0.598) 115(-7.651,-0.998) 116(-7.651,-1.398) 117(-7.651,-1.798) 118(-7.651,-2.198) 119(-7.651,-2.598) 120(-7.651,-2.998) 121(-7.651,-3.398) 122(-7.651,-3.798) 123(-7.651,-4.198) 124(-7.651,-4.598) 125(-7.651,-4.998) 126(-7.651,-5.398) 127(-7.651,-5.798) 128(-7.651,-6.198)
Top Overlay:
  circle w0.508: c-6.985,-8.001 r0.127
  circle w0.254: c-4.826,-4.824 r0.568
  lines w0.254: -6.096,-6.094 6.096,-6.094 6.096,6.098 -6.096,6.098 -6.096,-6.094
Mechanical 13:
  circle w0.1: c-6.1,-6.098 r0.5
  lines w0.1: -7,-6.998 -7,7.002 7,7.002 7,-6.998 -7,-6.998
Mechanical 15:
  circle w0.05: c0,0.002 r0.35
  lines w0.05: -0.5,0.002 0.5,0.002 ; 0,-0.498 0,0.502
  lines w0.1: -8.636,-8.636 8.636,-8.636 8.636,8.636 -8.636,8.636 -8.636,-8.636
3D body: height 1.05, standoff 0, extent -8.002,-8.002 8.002,8.002